# Altium footprint library DipComponent.PcbLib: 303 footprints (part 11 of 19)
Each footprint in its own frame and in the unit in brackets; x right, y up, seen from the top. Pads: shape width x height; smd on the part's side, far side on the other; paste and mask are expansions set on the pad; w line width, h text height; cw(c..) or ccw(c..) is an arc to the next point about the centre after c.
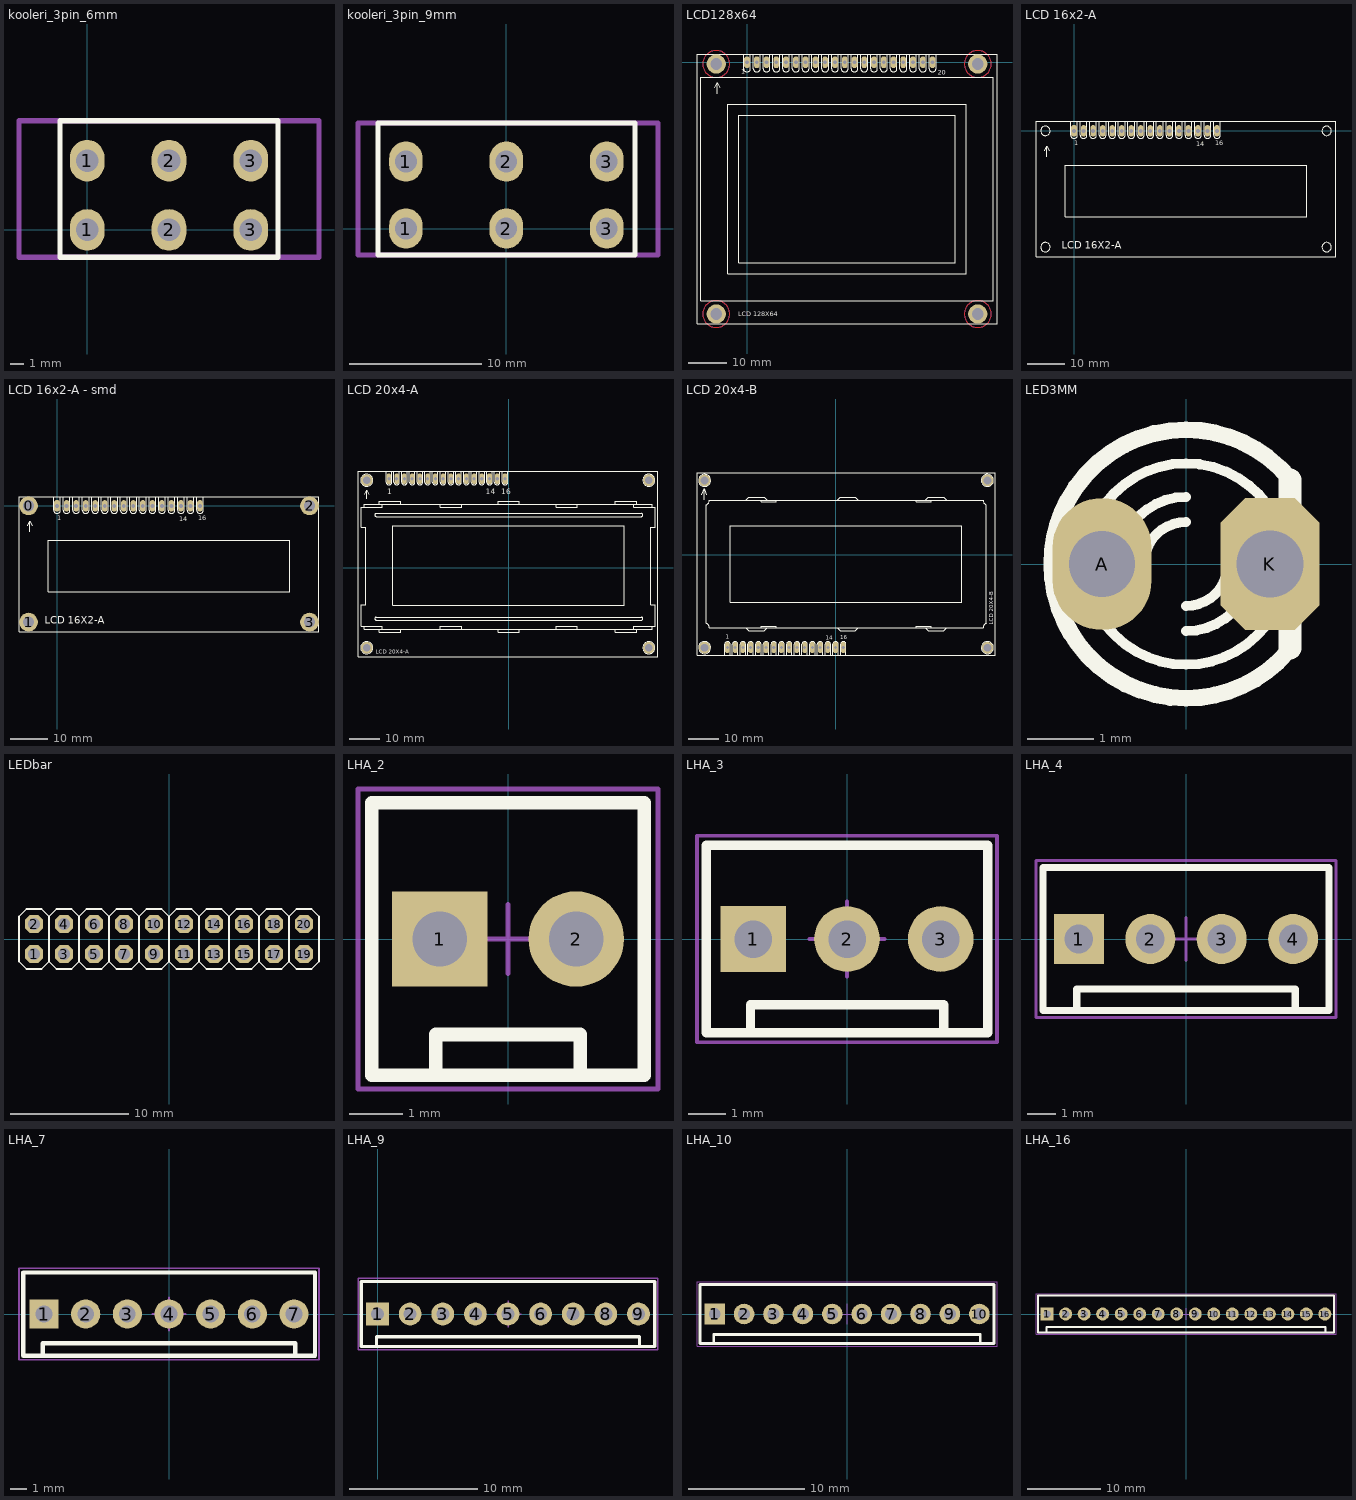
[diagram p10: the footprints below, top view; thin cyan lines are the x and y axes]

## kooleri_3pin_6mm [mil] "200mil"
pads (6):
  oval 100x120 hole 65: 1(0,0) 1(0,200) 2(236.22,0) 2(236.22,200) 3(472.44,0) 3(472.44,200)
Top Overlay:
  lines w15: -78.74,-78.74 551.18,-78.74 551.18,314.96 -78.74,314.96 -78.74,-78.74
Mechanical 15:
  lines w15: -196.85,-78.74 669.29,-78.74 669.29,314.96 -196.85,314.96 -196.85,-78.74

## kooleri_3pin_9mm [mil]
pads (6):
  oval 100x120 hole 65: 1(-300,0) 1(-300,200) 2(0,0) 2(0,200) 3(300,0) 3(300,200)
Top Overlay:
  lines w15: -383.86,-78.74 -383.86,314.96 383.86,314.96 383.86,-78.74 -383.86,-78.74
Mechanical 15:
  lines w15: -442.91,-78.74 -442.91,314.96 452.76,314.96 452.76,-78.74 -442.91,-78.74

## LCD128x64 [mm]
pads (24):
  oct 1.508x3.016 hole 1: 1(0,0) 2(2.54,0) 3(5.08,0) 4(7.62,0) 5(10.16,0) 6(12.7,0) 7(15.24,0) 8(17.78,0) 9(20.32,0) 10(22.86,0) 11(25.4,0) 12(27.94,0) 13(30.48,0) 14(33.02,0) 15(35.56,0) 16(38.1,0) 17(40.64,0) 18(43.18,0) 19(45.72,0) 20(48.26,0)
  round 5 hole 3 unplated: ""(-8,-65.46) ""(-8,-0.46) ""(60,-65.46) ""(60,-0.46)
Top Layer:
  circle w0.203: c-8,-0.46 r3.502
  circle w0.203: c60,-0.46 r3.5
  circle w0.203: c-8,-65.46 r3.5
  circle w0.203: c60,-65.46 r3.502
Bottom Layer:
  circle w0.203: c-8,-0.46 r3.501
  circle w0.203: c60,-0.46 r3.502
  circle w0.203: c60,-65.46 r3.502
  circle w0.203: c-8,-65.46 r3.505
Top Overlay:
  lines w0.127: -8.382,-6.604 -7.747,-5.334 -7.112,-6.604 ; -7.747,-8.146 -7.747,-5.461 ; -0.889,1.905 -0.889,-1.651 ccw(c0,-1.651) 0.889,-1.651 0.889,1.905 ; 1.651,1.905 1.651,-1.651 ccw(c2.54,-1.651) 3.429,-1.651 3.429,1.905 ; 4.191,1.905 4.191,-1.651 ccw(c5.08,-1.651) 5.969,-1.651 5.969,1.905 ; 6.731,1.905 6.731,-1.651 ccw(c7.62,-1.651) 8.509,-1.651 8.509,1.905 ; 9.271,1.905 9.271,-1.651 ccw(c10.16,-1.651) 11.049,-1.651 11.049,1.905 ; 11.811,1.905 11.811,-1.651 ccw(c12.7,-1.651) 13.589,-1.651 13.589,1.905 ; 14.351,1.905 14.351,-1.651 ccw(c15.24,-1.651) 16.129,-1.651 16.129,1.905 ; 16.891,1.905 16.891,-1.651 ccw(c17.78,-1.651) 18.669,-1.651 18.669,1.905 ; 19.431,1.905 19.431,-1.651 ccw(c20.32,-1.651) 21.209,-1.651 21.209,1.905 ; 21.971,1.905 21.971,-1.651 ccw(c22.86,-1.651) 23.749,-1.651 23.749,1.905 ; 24.511,1.905 24.511,-1.651 ccw(c25.4,-1.651) 26.289,-1.651 26.289,1.905 ; 27.051,1.905 27.051,-1.651 ccw(c27.94,-1.651) 28.829,-1.651 28.829,1.905 ; 29.591,1.905 29.591,-1.651 ccw(c30.48,-1.651) 31.369,-1.651 31.369,1.905 ; 32.131,1.905 32.131,-1.651 ccw(c33.02,-1.651) 33.909,-1.651 33.909,1.905 ; 34.671,1.905 34.671,-1.651 ccw(c35.56,-1.651) 36.449,-1.651 36.449,1.905 ; 37.211,1.905 37.211,-1.651 ccw(c38.1,-1.651) 38.989,-1.651 38.989,1.905 ; 39.751,1.905 39.751,-1.651 ccw(c40.64,-1.651) 41.529,-1.651 41.529,1.905 ; 42.291,1.905 42.291,-1.651 ccw(c43.18,-1.651) 44.069,-1.651 44.069,1.905 ; 44.831,1.905 44.831,-1.651 ccw(c45.72,-1.651) 46.609,-1.651 46.609,1.905 ; 47.371,1.905 47.371,-1.651 ccw(c48.26,-1.651) 49.149,-1.651 49.149,1.905
  lines w0.203: -13,-67.96 -13,2.04 65,2.04 65,-67.96 -13,-67.96 ; -12,-61.96 -12,-3.96 64,-3.96 64,-61.96 -12,-61.96 ; -5,-54.96 -5,-10.96 57,-10.96 57,-54.96 -5,-54.96 ; -2.13,-52.14 -2.13,-13.79 54.14,-13.79 54.14,-52.14 -2.13,-52.14
  text "20" at 49.53,-3.302 h1.27
  text "1" at -1.524,-3.048 h1.27
  text "LCD 128X64" at -2.286,-66.04 h1.27

## LCD 16x2-A [mil]
pads (16):
  oct 60x120 hole 40: 1(0,0)
  oval 60x120 hole 40: 2(100,0) 3(200,0) 4(300,0) 5(400,0) 6(500,0) 7(600,0) 8(700,0) 9(800,0) 10(900,0) 11(1000,0) 12(1100,0) 13(1200,0) 14(1300,0) 15(1400,0) 16(1500,0)
Top Overlay:
  circle w5: c-301.58,-1220.5 r49.21
  circle w5: c2651.18,-1220.5 r49.21
  circle w5: c-301.58,0 r49.21
  circle w5: c2651.18,0 r49.21
  lines w5: -310,-210 -285,-160 -260,-210 ; -285,-270.7 -285,-165 ; -35,95 -35,-45 ccw(c0,-45) 35,-45 35,95 ; 65,95 65,-45 ccw(c100,-45) 135,-45 135,95 ; 165,95 165,-45 ccw(c200,-45) 235,-45 235,95 ; 265,95 265,-45 ccw(c300,-45) 335,-45 335,95 ; 365,95 365,-45 ccw(c400,-45) 435,-45 435,95 ; 465,95 465,-45 ccw(c500,-45) 535,-45 535,95 ; 565,95 565,-45 ccw(c600,-45) 635,-45 635,95 ; 665,95 665,-45 ccw(c700,-45) 735,-45 735,95 ; 765,95 765,-45 ccw(c800,-45) 835,-45 835,95 ; 865,95 865,-45 ccw(c900,-45) 935,-45 935,95 ; 965,95 965,-45 ccw(c1000,-45) 1035,-45 1035,95 ; 1065,95 1065,-45 ccw(c1100,-45) 1135,-45 1135,95 ; 1165,95 1165,-45 ccw(c1200,-45) 1235,-45 1235,95 ; 1265,95 1265,-45 ccw(c1300,-45) 1335,-45 1335,95 ; 1365,95 1365,-45 ccw(c1400,-45) 1435,-45 1435,95 ; 1465,95 1465,-45 ccw(c1500,-45) 1535,-45 1535,95 ; -400,-1318.93 2749.6,-1318.93 2749.6,98.4 -400,98.4 -400,-1318.93 ; -94.88,-901.6 -94.88,-358.3 2444.49,-358.3 2444.49,-901.6 -94.88,-901.6
  text "14" at 1280,-160 h50
  text "1" at 0,-150 h50
  text "16" at 1480,-150 h50
  text "LCD 16X2-A" at -130,-1240 h75
3D body "SW3dPS-LCD module 16 X 2 backlight.STEP": height 807.7, standoff 287.7, extent -405.51,-1326.77 2763.78,110.24

## LCD 16x2-A - smd [mil]
pads (20):
  round 196.85 hole 118.11: 0(-300,0) 1(-300,-1220) 2(2650,0) 3(2650,-1220)
  oct 60x120 hole 40: 1(0,0)
  oval 60x120 hole 40: 2(100,0) 3(200,0) 4(300,0) 5(400,0) 6(500,0) 7(600,0) 8(700,0) 9(800,0) 10(900,0) 11(1000,0) 12(1100,0) 13(1200,0) 14(1300,0) 15(1400,0) 16(1500,0)
Top Overlay:
  circle w5: c-301.58,-1220.5 r49.21
  circle w5: c2651.18,-1220.5 r49.21
  circle w5: c-301.58,0 r49.21
  circle w5: c2651.18,0 r49.21
  lines w5: -310,-210 -285,-160 -260,-210 ; -285,-270.7 -285,-165 ; -35,95 -35,-45 ccw(c0,-45) 35,-45 35,95 ; 65,95 65,-45 ccw(c100,-45) 135,-45 135,95 ; 165,95 165,-45 ccw(c200,-45) 235,-45 235,95 ; 265,95 265,-45 ccw(c300,-45) 335,-45 335,95 ; 365,95 365,-45 ccw(c400,-45) 435,-45 435,95 ; 465,95 465,-45 ccw(c500,-45) 535,-45 535,95 ; 565,95 565,-45 ccw(c600,-45) 635,-45 635,95 ; 665,95 665,-45 ccw(c700,-45) 735,-45 735,95 ; 765,95 765,-45 ccw(c800,-45) 835,-45 835,95 ; 865,95 865,-45 ccw(c900,-45) 935,-45 935,95 ; 965,95 965,-45 ccw(c1000,-45) 1035,-45 1035,95 ; 1065,95 1065,-45 ccw(c1100,-45) 1135,-45 1135,95 ; 1165,95 1165,-45 ccw(c1200,-45) 1235,-45 1235,95 ; 1265,95 1265,-45 ccw(c1300,-45) 1335,-45 1335,95 ; 1365,95 1365,-45 ccw(c1400,-45) 1435,-45 1435,95 ; 1465,95 1465,-45 ccw(c1500,-45) 1535,-45 1535,95 ; -400,-1318.93 2749.6,-1318.93 2749.6,98.4 -400,98.4 -400,-1318.93 ; -94.88,-901.6 -94.88,-358.3 2444.49,-358.3 2444.49,-901.6 -94.88,-901.6
  text "14" at 1280,-160 h50
  text "1" at 0,-150 h50
  text "16" at 1480,-150 h50
  text "LCD 16X2-A" at -130,-1240 h75
3D body "SW3dPS-LCD module 16 X 2 backlight.STEP": height 807.7, standoff 287.7, extent -383.86,-1374.62 2785.44,62.38

## LCD 20x4-A [mil]
pads (20):
  oct 60x140 hole 40: 1(-1550.5,1150) 2(-1450.5,1150) 3(-1350.5,1150) 4(-1250.5,1150) 5(-1150.5,1150) 6(-1050.5,1150) 7(-950.5,1150) 8(-850.5,1150) 9(-750.5,1150) 10(-650.5,1150) 11(-550.5,1150) 12(-450.5,1150) 13(-350.5,1150) 14(-250.5,1150) 15(-150.5,1150) 16(-50.5,1150)
  round 150 hole 100: P$1(-1837.5,-1035) P$2(1808.5,-1035) P$3(1808.5,1130.5) P$4(-1837.5,1130)
Top Overlay:
  drawing of 163 lines, arcs and shapes, not listed
  text "LCD 20X4-A" at -1719.69,-1112.2 h50
  text "14" at -300,950 h70
  text "16" at -100,950 h70
  text "1" at -1575,950 h70

## LCD 20x4-B [mil]
pads (20):
  oct 60x140 hole 40: 1(-1400.5,-1199) 2(-1300.5,-1199) 3(-1200.5,-1199) 4(-1100.5,-1199) 5(-1000.5,-1199) 6(-900.5,-1199) 7(-800.5,-1199) 8(-700.5,-1199) 9(-600.5,-1199) 10(-500.5,-1199) 11(-400.5,-1199) 12(-300.5,-1199) 13(-200.5,-1199) 14(-100.5,-1199) 15(-0.5,-1199) 16(99.5,-1199)
  round 150 hole 100: P$1(-1695.5,965.5) P$2(-1695.5,-1199.5) P$3(1966,-1200) P$4(1966,965.5)
Top Overlay:
  circle w5: c-1695.5,965.5 r78
  circle w5: c1966,965.5 r78
  circle w5: c1966,-1199.5 r78
  circle w5: c-1695.5,-1199.5 r78
  lines w5: -1734.95,-1199.6 -1656.21,-1199.6 ; -1734.95,965.8 -1656.21,965.8 ; -1730,778.7 -1700,859 -1675,778.7 ; -1700,716.5 -1700,844 ; -1695.58,-1239 -1695.58,-1160.2 ; -1695.58,926.4 -1695.58,1005.1 ; -1673.23,-885.9 -1673.23,649.6 ; -1673.23,-885.83 cw(c-1692.91,-941.6) -1633.86,-944.88 -1161.42,-944.9 ; -1673.23,649.53 ccw(c-1692.91,705.3) -1633.86,708.58 -1161.42,708.6 ; -1435,-1295 -1435,-1155 cw(c-1400,-1157.5) -1365,-1160 -1365,-1295 ; -1335,-1295 -1335,-1155 cw(c-1300,-1157.5) -1265,-1160 -1265,-1295 ; -1235,-1295 -1235,-1155 cw(c-1200,-1157.5) -1165,-1160 -1165,-1295 ; -1135,-1295 -1135,-1155 cw(c-1100,-1157.5) -1065,-1160 -1065,-1295 ; -1035,-1295 -1035,-1155 cw(c-1000,-1157.5) -965,-1160 -965,-1295 ; -935,-1295 -935,-1155 cw(c-900,-1157.5) -865,-1160 -865,-1295 ; -835,-1295 -835,-1155 cw(c-800,-1157.5) -765,-1160 -765,-1295 ; -735,-1295 -735,-1155 cw(c-700,-1157.5) -665,-1160 -665,-1295 ; -635,-1295 -635,-1155 cw(c-600,-1157.5) -565,-1160 -565,-1295 ; -535,-1295 -535,-1155 cw(c-500,-1157.5) -465,-1160 -465,-1295 ; -435,-1295 -435,-1155 cw(c-400,-1157.5) -365,-1160 -365,-1295 ; -335,-1295 -335,-1155 cw(c-300,-1157.5) -265,-1160 -265,-1295 ; -235,-1295 -235,-1155 cw(c-200,-1157.5) -165,-1160 -165,-1295 ; -135,-1295 -135,-1155 cw(c-100,-1157.5) -65,-1160 -65,-1295 ; -35,-1295 -35,-1155 cw(c0,-1157.5) 35,-1160 35,-1295 ; 65,-1295 65,-1155 cw(c100,-1157.5) 135,-1160 135,-1295 ; 1631.19,316.1 1631.19,375.2 ; 1926.47,-1199.6 2005.21,-1199.6 ; 1926.47,965.8 2005.21,965.8 ; 1948.82,-885.9 1948.82,649.6 ; 1948.82,-885.83 ccw(c1968.5,-941.6) 1909.45,-944.88 1437.01,-944.9 ; 1948.82,649.53 cw(c1968.5,705.3) 1909.45,708.58 1437.01,708.6 ; 1965.84,-1239 1965.84,-1160.2 ; 1965.84,926.4 1965.84,1005.1 ; -1161.42,-944.9 -1122.05,-984.3 -925.2,-984.3 -885.83,-944.9 ; -1161.42,-944.9 -964.57,-944.9 ; -1161.42,708.6 -1122.05,748 -925.2,748 -885.83,708.6 ; -1161.42,708.6 -964.57,708.6 ; -964.57,-944.9 -964.57,-925.2 -767.72,-925.2 -767.72,-944.9 ; -964.57,-944.9 -885.83,-944.9 ; -964.57,708.6 -964.57,688.9 -767.72,688.9 -767.72,708.6 ; -964.57,708.6 -885.83,708.6 ; -885.83,-944.9 -767.72,-944.9 ; -885.83,708.6 -767.72,708.6 ; -767.72,-944.9 19.68,-944.9 ; -767.72,708.6 19.68,708.6 ; 19.68,-944.9 59.05,-984.3 255.9,-984.3 295.27,-944.9 ; 19.68,-944.9 295.27,-944.9 ; 19.68,708.6 59.05,748 255.9,748 295.27,708.6 ; 19.68,708.6 295.27,708.6 ; 295.27,-944.9 1043.31,-944.9 ; 295.27,708.6 1043.31,708.6 ; 1043.31,-944.9 1043.31,-925.2 1240.16,-925.2 1240.16,-944.9 ; 1043.31,-944.9 1161.42,-944.9 ; 1043.31,708.6 1043.31,688.9 1240.16,688.9 1240.16,708.6 ; 1043.31,708.6 1161.42,708.6 ; 1161.42,-944.9 1200.79,-984.3 1397.64,-984.3 1437.01,-944.9 ; 1161.42,-944.9 1240.16,-944.9 ; 1161.42,708.6 1200.79,748 1397.64,748 1437.01,708.6 ; 1161.42,708.6 1240.16,708.6 ; 1240.16,-944.9 1437.01,-944.9 ; 1240.16,708.6 1437.01,708.6 ; 1631.19,375.2 1631.19,-609.1 -1360.93,-609.1 -1360.93,375.2 1631.19,375.2 ; -1794,-1298 -1794,1064.2 2064.27,1064.2 2064.27,-1298 -1794,-1298
  text "LCD 20X4-B" at 2040.16,-903.2 h50
  text "16" at 60,-1094 h50
  text "1" at -1420,-1084 h50
  text "14" at -130,-1100 h50

## LED3MM [mm]
pads (2):
  oval 1.5x2 hole 1: A(-1.27,0)
  oct 1.5x2 hole 1.016: K(1.27,0)
Top Overlay:
  lines w0.152: -1.219,0.914 cw(c0,0) 0,1.524 cw(c0,0) 1.24,0.886 ; -1.203,-0.936 ccw(c0,0) 0,-1.524 ccw(c0,0) 1.203,-0.936 ; -1.171,0.976 ccw(c0,0) -1.524,0 ccw(c0,0) -1.139,-1.012 ; -1.016,0 cw(c0,0) 0,1.016 ; -0.635,0 cw(c0,0) 0,0.635 ; 0,-1.016 ccw(c0,0) 1.016,0 ; 0,-0.635 ccw(c0,0) 0.635,0 ; 1.157,0.992 cw(c0,0) 1.524,0 cw(c0,0) 1.171,-0.976
  lines w0.254: -1.793,0.956 cw(c0,0) 0,2.032 cw(c0,0) 1.561,1.301 ; -1.789,0.963 ccw(c0,0) -2.032,0 ccw(c0,0) -1.731,-1.065 ; -1.764,-1.008 ccw(c0,0) 0,-2.032 ccw(c0,0) 1.551,-1.313
  lines w0.349: 1.575,-1.27 1.575,1.27
3D body "ALSRobot-LED Red 3mm.step": height 5.4, standoff -2.8, extent -1.946,-1.945 1.549,2.047

## LEDbar [mil]
pads (20):
  oct 60x60 hole 40: 1(-450,-50) 2(-450,50) 3(-350,-50) 4(-350,50) 5(-250,-50) 6(-250,50) 7(-150,-50) 8(-150,50) 9(-50,-50) 10(-50,50) 11(50,-50) 12(50,50) 13(150,-50) 14(150,50) 15(250,-50) 16(250,50) 17(350,-50) 18(350,50) 19(450,-50) 20(450,50)
Top Overlay:
  lines w6: -400,-75 -400,75 ; -400,-75 -375,-100 -325,-100 -300,-75 ; -400,-75 -425,-100 -475,-100 -500,-75 -500,75 -475,100 -425,100 -400,75 ; -400,75 -375,100 -325,100 -300,75 ; -300,-75 -300,75 ; -300,-75 -275,-100 -225,-100 -200,-75 ; -300,75 -275,100 -225,100 -200,75 ; -200,-75 -200,75 ; -200,-75 -175,-100 -125,-100 -100,-75 ; -200,75 -175,100 -125,100 -100,75 ; -100,-75 -100,75 ; -100,-75 -75,-100 -25,-100 0,-75 ; -100,75 -75,100 -25,100 0,75 ; 0,-75 0,75 ; 0,-75 25,-100 75,-100 100,-75 ; 0,75 25,100 75,100 100,75 ; 100,-75 100,75 ; 100,-75 125,-100 175,-100 200,-75 ; 100,75 125,100 175,100 200,75 ; 200,-75 200,75 ; 200,-75 225,-100 275,-100 300,-75 ; 200,75 225,100 275,100 300,75 ; 300,-75 300,75 ; 300,-75 325,-100 375,-100 400,-75 ; 300,75 325,100 375,100 400,75 ; 400,-75 425,-100 475,-100 500,-75 500,75 475,100 425,100 400,75 ; 400,-75 400,75
3D body "Segment Bar Graph or LED Array.step": height 318.11, standoff -81.89, extent -500,-383.86 500,159.45

## LHA_2 [mil] "Connector; Signal; 2 Position ,2.54mm Pitch"
height 452.76
pads (2):
  rect 70x70 hole 40: 1(-50,0)
  round 70 hole 40: 2(50,0)
Top Overlay:
  lines w10: -53,-100 -100,-100 -100,100 100,100 100,-100 53,-100 ; -53,-100 -53,-70 53,-70 53,-100 ; -53,-100 53,-100
Mechanical 13:
  lines w3.94: -53,-100 53,-100 ; -53,-100 -53,-70 53,-70 53,-100 ; -53,-100 -100,-100 -100,100 100,100 100,-100 53,-100 ; -63.78,-13.78 -36.22,-13.78 -36.22,13.78 -63.78,13.78 -63.78,-13.78 ; 36.22,-13.78 36.22,13.78 63.78,13.78 63.78,-13.78 36.22,-13.78
Mechanical 15:
  lines w3.94: -25,0 0,0 ; 0,-25 0,0 ; 0,25 0,0 ; 25,0 0,0 ; -110,-110 110,-110 110,110 -110,110 -110,-110
3D body: height 133.86, standoff 0, extent -99.98,-99.98 99.98,99.98
3D body: height 452.76, standoff 0, extent -52.98,-99.98 52.98,-70.02
3D body: height 425.2, standoff -133.86, extent -63.76,-13.76 -36.24,13.76
3D body: height 425.2, standoff -133.86, extent 36.24,-13.76 63.76,13.76

## LHA_3 [mil] "Connector; Signal; 3 Position ,2.54mm Pitch"
height 452.76
pads (3):
  rect 70x70 hole 40: 1(-100,0)
  round 70 hole 40: 2(0,0) 3(100,0)
Top Overlay:
  lines w10: -103,-100 -150,-100 -150,100 150,100 150,-100 103,-100 ; -103,-100 103,-100 ; -103,-100 -103,-70 103,-70 103,-100
Mechanical 13:
  lines w3.94: -103,-100 -103,-70 103,-70 103,-100 ; -103,-100 103,-100 ; -103,-100 -150,-100 -150,100 150,100 150,-100 103,-100 ; -113.78,-13.78 -113.78,13.78 -86.22,13.78 -86.22,-13.78 -113.78,-13.78 ; -13.78,-13.78 13.78,-13.78 13.78,13.78 -13.78,13.78 -13.78,-13.78 ; 86.22,-13.78 86.22,13.78 113.78,13.78 113.78,-13.78 86.22,-13.78
Mechanical 15:
  lines w3.94: -40,0 0,0 ; 0,-40 0,0 ; 0,40 0,0 ; 40,0 0,0 ; -160,-110 160,-110 160,110 -160,110 -160,-110
3D body: height 425.2, standoff -133.86, extent 86.24,-13.76 113.76,13.76
3D body: height 425.2, standoff -133.86, extent -13.76,-13.76 13.76,13.76
3D body: height 425.2, standoff -133.86, extent -113.76,-13.76 -86.24,13.76
3D body: height 133.86, standoff 0, extent -149.98,-99.98 149.98,99.98
3D body: height 452.76, standoff 0, extent -102.98,-99.98 102.98,-70.02

## LHA_4 [mil] "Connector; Signal; 4 Position ,2.54mm Pitch"
height 452.76
pads (4):
  rect 70x70 hole 40: 1(-150,0)
  round 70 hole 40: 2(-50,0) 3(50,0) 4(150,0)
Top Overlay:
  lines w10: -153,-100 -153,-70 153,-70 153,-100 ; -153,-100 153,-100 ; -153,-100 -200,-100 -200,100 200,100 200,-100 153,-100
Mechanical 13:
  lines w3.94: -153,-100 -200,-100 -200,100 200,100 200,-100 153,-100 ; -153,-100 153,-100 ; -153,-100 -153,-70 153,-70 153,-100 ; -163.78,-13.78 -136.22,-13.78 -136.22,13.78 -163.78,13.78 -163.78,-13.78 ; -63.78,-13.78 -63.78,13.78 -36.22,13.78 -36.22,-13.78 -63.78,-13.78 ; 36.22,-13.78 63.78,-13.78 63.78,13.78 36.22,13.78 36.22,-13.78 ; 136.22,-13.78 136.22,13.78 163.78,13.78 163.78,-13.78 136.22,-13.78
Mechanical 15:
  lines w3.94: -30,0 0,0 ; 0,-30 0,0 ; 0,30 0,0 ; 30,0 0,0 ; -210,-110 210,-110 210,110 -210,110 -210,-110
3D body: height 452.76, standoff 0, extent -152.98,-99.98 152.98,-70.02
3D body: height 133.86, standoff 0, extent -199.98,-99.98 199.98,99.98
3D body: height 425.2, standoff -133.86, extent -163.76,-13.76 -136.24,13.76
3D body: height 425.2, standoff -133.86, extent -63.76,-13.76 -36.24,13.76
3D body: height 425.2, standoff -133.86, extent 36.24,-13.76 63.76,13.76
3D body: height 425.2, standoff -133.86, extent 136.24,-13.76 163.76,13.76

## LHA_7 [mil] "Connector; Signal; 6 Position ,2.54mm Pitch"
height 452.76
pads (7):
  rect 70x70 hole 40: 1(-300,0)
  round 70 hole 40: 2(-200,0) 3(-100,0) 4(0,0) 5(100,0) 6(200,0) 7(300,0)
Top Overlay:
  lines w10: -303,-100 -350,-100 -350,100 350,100 350,-100 303,-100 ; -303,-100 303,-100 ; -303,-100 -303,-70 303,-70 303,-100
Mechanical 13:
  lines w3.94: -303,-100 -303,-70 303,-70 303,-100 ; -303,-100 303,-100 ; -303,-100 -350,-100 -350,100 350,100 350,-100 303,-100 ; -313.78,-13.78 -313.78,13.78 -286.22,13.78 -286.22,-13.78 -313.78,-13.78 ; -213.78,-13.78 -186.22,-13.78 -186.22,13.78 -213.78,13.78 -213.78,-13.78 ; -113.78,-13.78 -113.78,13.78 -86.22,13.78 -86.22,-13.78 -113.78,-13.78 ; -13.78,-13.78 13.78,-13.78 13.78,13.78 -13.78,13.78 -13.78,-13.78 ; 86.22,-13.78 86.22,13.78 113.78,13.78 113.78,-13.78 86.22,-13.78 ; 186.22,-13.78 213.78,-13.78 213.78,13.78 186.22,13.78 186.22,-13.78 ; 286.22,-13.78 286.22,13.78 313.78,13.78 313.78,-13.78 286.22,-13.78
Mechanical 15:
  lines w3.94: -40,0 0,0 ; 0,-40 0,0 ; 0,40 0,0 ; 40,0 0,0 ; -360,-110 360,-110 360,110 -360,110 -360,-110
3D body: height 452.76, standoff 0, extent -302.98,-99.98 302.98,-70.02
3D body: height 133.86, standoff 0, extent -349.98,-99.98 349.98,99.98
3D body: height 425.2, standoff -133.86, extent -213.76,-13.76 -186.24,13.76
3D body: height 425.2, standoff -133.86, extent -313.76,-13.76 -286.24,13.76
3D body: height 425.2, standoff -133.86, extent -13.76,-13.76 13.76,13.76
3D body: height 425.2, standoff -133.86, extent -113.76,-13.76 -86.24,13.76
3D body: height 425.2, standoff -133.86, extent 186.24,-13.76 213.76,13.76
3D body: height 425.2, standoff -133.86, extent 86.24,-13.76 113.76,13.76
3D body: height 425.2, standoff -133.86, extent 286.24,-13.76 313.76,13.76

## LHA_9 [mil] "Connector; Signal; 9 Position ,2.54mm Pitch"
height 452.76
pads (9):
  rect 70x70 hole 40: 1(0,0)
  round 70 hole 40: 2(100,0) 3(200,0) 4(300,0) 5(400,0) 6(500,0) 7(600,0) 8(700,0) 9(800,0)
Top Overlay:
  lines w10: -3,-100 -3,-70 803,-70 803,-100 ; -3,-100 803,-100 ; -3,-100 -50,-100 -50,100 850,100 850,-100 803,-100
Mechanical 13:
  lines w3.94: -3,-100 -50,-100 -50,100 850,100 850,-100 803,-100 ; -3,-100 803,-100 ; -3,-100 -3,-70 803,-70 803,-100 ; -13.78,-13.78 -13.78,13.78 13.78,13.78 13.78,-13.78 -13.78,-13.78 ; 86.22,-13.78 113.78,-13.78 113.78,13.78 86.22,13.78 86.22,-13.78 ; 186.22,-13.78 186.22,13.78 213.78,13.78 213.78,-13.78 186.22,-13.78 ; 286.22,-13.78 313.78,-13.78 313.78,13.78 286.22,13.78 286.22,-13.78 ; 386.22,-13.78 386.22,13.78 413.78,13.78 413.78,-13.78 386.22,-13.78 ; 486.22,-13.78 513.78,-13.78 513.78,13.78 486.22,13.78 486.22,-13.78 ; 586.22,-13.78 586.22,13.78 613.78,13.78 613.78,-13.78 586.22,-13.78 ; 686.22,-13.78 713.78,-13.78 713.78,13.78 686.22,13.78 686.22,-13.78 ; 786.22,-13.78 786.22,13.78 813.78,13.78 813.78,-13.78 786.22,-13.78
Mechanical 15:
  lines w3.94: 360,0 400,0 ; 400,-40 400,0 ; 400,40 400,0 ; 440,0 400,0 ; -60,-110 860,-110 860,110 -60,110 -60,-110
3D body: height 425.2, standoff -133.86, extent 786.24,-13.76 813.76,13.76
3D body: height 425.2, standoff -133.86, extent 686.24,-13.76 713.76,13.76
3D body: height 425.2, standoff -133.86, extent 586.24,-13.76 613.76,13.76
3D body: height 425.2, standoff -133.86, extent 486.24,-13.76 513.76,13.76
3D body: height 425.2, standoff -133.86, extent 386.24,-13.76 413.76,13.76
3D body: height 425.2, standoff -133.86, extent 286.24,-13.76 313.76,13.76
3D body: height 425.2, standoff -133.86, extent 186.24,-13.76 213.76,13.76
3D body: height 425.2, standoff -133.86, extent 86.24,-13.76 113.76,13.76
3D body: height 425.2, standoff -133.86, extent -13.76,-13.76 13.76,13.76
3D body: height 133.86, standoff 0, extent -49.98,-99.98 849.98,99.98
3D body: height 452.76, standoff 0, extent -2.98,-99.98 802.98,-70.02

## LHA_10 [mil] "Connector; Signal; 10 Position ,2.54mm Pitch"
height 452.76
pads (10):
  rect 70x70 hole 40: 1(-450,0)
  round 70 hole 40: 2(-350,0) 3(-250,0) 4(-150,0) 5(-50,0) 6(50,0) 7(150,0) 8(250,0) 9(350,0) 10(450,0)
Top Overlay:
  lines w10: -453,-100 -500,-100 -500,100 500,100 500,-100 453,-100 ; -453,-100 453,-100 ; -453,-100 -453,-70 453,-70 453,-100
Mechanical 13:
  lines w3.94: -453,-100 -453,-70 453,-70 453,-100 ; -453,-100 453,-100 ; -453,-100 -500,-100 -500,100 500,100 500,-100 453,-100 ; -463.78,-13.78 -436.22,-13.78 -436.22,13.78 -463.78,13.78 -463.78,-13.78 ; -363.78,-13.78 -363.78,13.78 -336.22,13.78 -336.22,-13.78 -363.78,-13.78 ; -263.78,-13.78 -236.22,-13.78 -236.22,13.78 -263.78,13.78 -263.78,-13.78 ; -163.78,-13.78 -163.78,13.78 -136.22,13.78 -136.22,-13.78 -163.78,-13.78 ; -63.78,-13.78 -36.22,-13.78 -36.22,13.78 -63.78,13.78 -63.78,-13.78 ; 36.22,-13.78 36.22,13.78 63.78,13.78 63.78,-13.78 36.22,-13.78 ; 136.22,-13.78 163.78,-13.78 163.78,13.78 136.22,13.78 136.22,-13.78 ; 236.22,-13.78 236.22,13.78 263.78,13.78 263.78,-13.78 236.22,-13.78 ; 336.22,-13.78 363.78,-13.78 363.78,13.78 336.22,13.78 336.22,-13.78 ; 436.22,-13.78 436.22,13.78 463.78,13.78 463.78,-13.78 436.22,-13.78
Mechanical 15:
  lines w3.94: -35,0 0,0 ; 0,-35 0,0 ; 0,35 0,0 ; 35,0 0,0 ; -510,-110 -510,110 510,110 510,-110 -510,-110
3D body: height 452.76, standoff 0, extent -452.98,-99.98 452.98,-70.02
3D body: height 133.86, standoff 0, extent -499.98,-99.98 499.98,99.98
3D body: height 425.2, standoff -133.86, extent -463.76,-13.76 -436.24,13.76
3D body: height 425.2, standoff -133.86, extent -363.76,-13.76 -336.24,13.76
3D body: height 425.2, standoff -133.86, extent -263.76,-13.76 -236.24,13.76
3D body: height 425.2, standoff -133.86, extent -163.76,-13.76 -136.24,13.76
3D body: height 425.2, standoff -133.86, extent -63.76,-13.76 -36.24,13.76
3D body: height 425.2, standoff -133.86, extent 36.24,-13.76 63.76,13.76
3D body: height 425.2, standoff -133.86, extent 136.24,-13.76 163.76,13.76
3D body: height 425.2, standoff -133.86, extent 236.24,-13.76 263.76,13.76
3D body: height 425.2, standoff -133.86, extent 336.24,-13.76 363.76,13.76
3D body: height 425.2, standoff -133.86, extent 436.24,-13.76 463.76,13.76

## LHA_16 [mil] "Connector; Signal; 16 Position ,2.54mm Pitch"
height 452.76
pads (16):
  rect 70x70 hole 40: 1(-750,0)
  round 70 hole 40: 2(-650,0) 3(-550,0) 4(-450,0) 5(-350,0) 6(-250,0) 7(-150,0) 8(-50,0) 9(50,0) 10(150,0) 11(250,0) 12(350,0) 13(450,0) 14(550,0) 15(650,0) 16(750,0)
Top Overlay:
  lines w10: -753,-100 -800,-100 -800,100 800,100 800,-100 753,-100 ; -753,-100 -753,-70 753,-70 753,-100 ; -753,-100 753,-100
Mechanical 13:
  lines w3.94: -753,-100 753,-100 ; -753,-100 -753,-70 753,-70 753,-100 ; -753,-100 -800,-100 -800,100 800,100 800,-100 753,-100 ; -763.78,-13.78 -736.22,-13.78 -736.22,13.78 -763.78,13.78 -763.78,-13.78 ; -663.78,-13.78 -663.78,13.78 -636.22,13.78 -636.22,-13.78 -663.78,-13.78 ; -563.78,-13.78 -536.22,-13.78 -536.22,13.78 -563.78,13.78 -563.78,-13.78 ; -463.78,-13.78 -463.78,13.78 -436.22,13.78 -436.22,-13.78 -463.78,-13.78 ; -363.78,-13.78 -336.22,-13.78 -336.22,13.78 -363.78,13.78 -363.78,-13.78 ; -263.78,-13.78 -263.78,13.78 -236.22,13.78 -236.22,-13.78 -263.78,-13.78 ; -163.78,-13.78 -136.22,-13.78 -136.22,13.78 -163.78,13.78 -163.78,-13.78 ; -63.78,-13.78 -63.78,13.78 -36.22,13.78 -36.22,-13.78 -63.78,-13.78 ; 36.22,-13.78 63.78,-13.78 63.78,13.78 36.22,13.78 36.22,-13.78 ; 136.22,-13.78 136.22,13.78 163.78,13.78 163.78,-13.78 136.22,-13.78 ; 236.22,-13.78 263.78,-13.78 263.78,13.78 236.22,13.78 236.22,-13.78 ; 336.22,-13.78 336.22,13.78 363.78,13.78 363.78,-13.78 336.22,-13.78 ; 436.22,-13.78 463.78,-13.78 463.78,13.78 436.22,13.78 436.22,-13.78 ; 536.22,-13.78 536.22,13.78 563.78,13.78 563.78,-13.78 536.22,-13.78 ; 636.22,-13.78 663.78,-13.78 663.78,13.78 636.22,13.78 636.22,-13.78 ; 736.22,-13.78 736.22,13.78 763.78,13.78 763.78,-13.78 736.22,-13.78
Mechanical 15:
  lines w3.94: -30,0 0,0 ; 0,-30 0,0 ; 0,30 0,0 ; 30,0 0,0 ; -810,-110 -810,110 810,110 810,-110 -810,-110
3D body: height 452.76, standoff 0, extent -752.98,-99.98 752.98,-70.02
3D body: height 137.8, standoff 0, extent -799.98,-99.98 799.98,99.98
3D body: height 425.2, standoff -133.86, extent -163.76,-13.76 -136.24,13.76
3D body: height 425.2, standoff -133.86, extent -63.76,-13.76 -36.24,13.76
3D body: height 425.2, standoff -133.86, extent -363.76,-13.76 -336.24,13.76
3D body: height 425.2, standoff -133.86, extent -263.76,-13.76 -236.24,13.76
3D body: height 425.2, standoff -133.86, extent -563.76,-13.76 -536.24,13.76
3D body: height 425.2, standoff -133.86, extent -463.76,-13.76 -436.24,13.76
3D body: height 425.2, standoff -133.86, extent -763.76,-13.76 -736.24,13.76
3D body: height 425.2, standoff -133.86, extent -663.76,-13.76 -636.24,13.76
3D body: height 425.2, standoff -133.86, extent 636.24,-13.76 663.76,13.76
3D body: height 425.2, standoff -133.86, extent 736.24,-13.76 763.76,13.76
3D body: height 425.2, standoff -133.86, extent 436.24,-13.76 463.76,13.76
3D body: height 425.2, standoff -133.86, extent 536.24,-13.76 563.76,13.76
3D body: height 425.2, standoff -133.86, extent 236.24,-13.76 263.76,13.76
3D body: height 425.2, standoff -133.86, extent 336.24,-13.76 363.76,13.76
3D body: height 425.2, standoff -133.86, extent 36.24,-13.76 63.76,13.76
3D body: height 425.2, standoff -133.86, extent 136.24,-13.76 163.76,13.76